# Altium footprint library texas.PCBLIB: 168 footprints (part 3 of 14)
Each footprint in its own frame and in the unit in brackets; x right, y up, seen from the top. Pads: shape width x height; smd on the part's side, far side on the other; paste and mask are expansions set on the pad; w line width, h text height; cw(c..) or ccw(c..) is an arc to the next point about the centre after c.
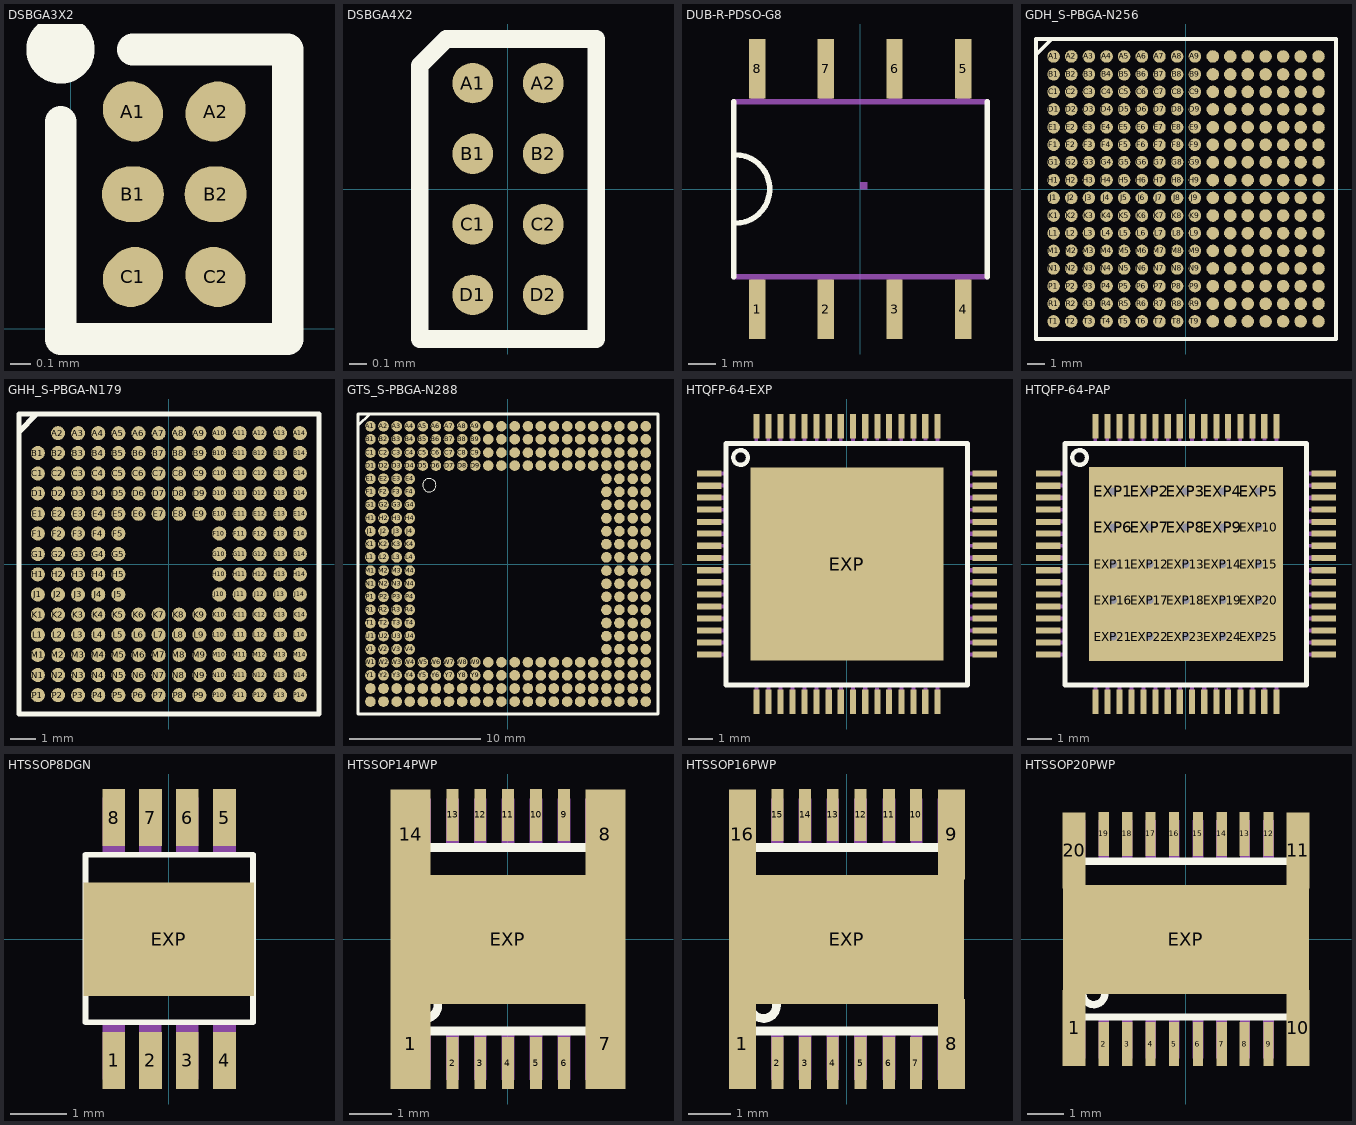
[diagram p2: the footprints below, top view; thin cyan lines are the x and y axes]

## DSBGA3X2 [mm]
height 0.65
pads (6):
  oval 0.3x0.27 smd rot 135 mask+0.05: A1(0.3,1.05) C2(0.7,0.25)
  oval 0.3x0.27 smd rot 45 mask+0.05: A2(0.7,1.05) C1(0.3,0.25)
  oval 0.3x0.27 smd mask+0.05: B1(0.3,0.65) B2(0.7,0.65)
Top Overlay:
  circle w0.229: c-0.05,1.35 r0.051
  lines w0.152: -0.05,1 -0.05,-0.05 1.05,-0.05 1.05,1.35 0.3,1.35

## DSBGA4X2 [mm]
height 0.65
pads (8):
  round 0.23 smd mask+0.05: A1(-0.2,0.6) A2(0.2,0.6) B1(-0.2,0.2) B2(0.2,0.2) C1(-0.2,-0.2) C2(0.2,-0.2) D1(-0.2,-0.6) D2(0.2,-0.6)
Top Overlay:
  lines w0.1: -0.5,-0.85 -0.5,0.7 -0.35,0.85 0.5,0.85 0.5,-0.85 -0.5,-0.85

## DUB-R-PDSO-G8 [mil]
pads (8):
  rect 24x87 smd: 1(-150,-175) 2(-50,-175) 3(50,-175) 4(150,-175) 5(150,175) 6(50,175) 7(-50,175) 8(-150,175)
Top Overlay:
  lines w8: -184.06,-127.95 -184.06,127 ; -181.89,-50 ccw(c-181.89,0) -181.89,50 ; 185,-127.95 185,127
Mechanical 4:
  rectangle: -159.65,125 -140.35,211
  rectangle: -59.65,125 -40.35,211
  rectangle: 41,125 60,211
  rectangle: 141,125 160,211
  rectangle: 141,-210.63 160,-125
  rectangle: 41,-210.63 60,-125
  rectangle: -59.65,-210.63 -40.35,-125
  rectangle: -159.65,-210.63 -140.35,-125
  region: 0,0 10,0 10,10 0,10
  region: 0,0 10,0 10,10 0,10
  region: 0,0 10,0 10,10 0,10
  region: 0,0 10,0 10,10 0,10
  region: 0,0 10,0 10,10 0,10
  region: 0,0 10,0 10,10 0,10
  region: 0,0 10,0 10,10 0,10
  region: 0,0 10,0 10,10 0,10
  region: 0,0 10,0 10,10 0,10
  region: 0,0 10,0 10,10 0,10
  region: 0,0 10,0 10,10 0,10
  region: 0,0 10,0 10,10 0,10
  lines w8: -184.06,-127.95 185,-127.95 ; -184.06,127 185,127

## GDH_S-PBGA-N256 [mil]
pads (256):
  rrect100% 28x28 smd: A1(-295.28,296) A2(-255.91,296) A3(-216.54,296) A4(-177.17,296) A5(-137.8,296) A6(-98.43,296) A7(-59.06,296) A8(-19.68,296) A9(20,296) A10(60,296) A11(99,296) A12(138,296) A13(178,296) A14(217,296) A15(256,296) A16(296,296) B1(-295.28,256) B2(-255.91,256) B3(-216.54,256) B4(-177.17,256) B5(-137.8,256) B6(-98.43,256) B7(-59.06,256) B8(-19.68,256) B9(20,256) B10(60,256) B11(99,256) B12(138,256) B13(178,256) B14(217,256) B15(256,256) B16(296,256) C1(-295.28,217) C2(-255.91,217) C3(-216.54,217) C4(-177.17,217) C5(-137.8,217) C6(-98.43,217) C7(-59.06,217) C8(-19.68,217) C9(20,217) C10(60,217) C11(99,217) C12(138,217) C13(178,217) C14(217,217) C15(256,217) C16(296,217) D1(-295.28,178) D2(-255.91,178) D3(-216.54,178) D4(-177.17,178) D5(-137.8,178) D6(-98.43,178) D7(-59.06,178) D8(-19.68,178) D9(20,178) D10(60,178) D11(99,178) D12(138,178) D13(178,178) D14(217,178) D15(256,178) D16(296,178) E1(-295.28,138) E2(-255.91,138) E3(-216.54,138) E4(-177.17,138) E5(-137.8,138) E6(-98.43,138) E7(-59.06,138) E8(-19.68,138) E9(20,138) E10(60,138) E11(99,138) E12(138,138) E13(178,138) E14(217,138) E15(256,138) E16(296,138) F1(-295.28,99) F2(-255.91,99) F3(-216.54,99) F4(-177.17,99) F5(-137.8,99) F6(-98.43,99) F7(-59.06,99) F8(-19.68,99) F9(20,99) F10(60,99) F11(99,99) F12(138,99) F13(178,99) F14(217,99) F15(256,99) F16(296,99) G1(-295.28,60) G2(-255.91,60) G3(-216.54,60) G4(-177.17,60) G5(-137.8,60) G6(-98.43,60) G7(-59.06,60) G8(-19.68,60) G9(20,60) G10(60,60) G11(99,60) G12(138,60) G13(178,60) G14(217,60) G15(256,60) G16(296,60) H1(-295.28,20) H2(-255.91,20) H3(-216.54,20) H4(-177.17,20) H5(-137.8,20) H6(-98.43,20) H7(-59.06,20) H8(-19.68,20) H9(20,20) H10(60,20) H11(99,20) H12(138,20) H13(178,20) H14(217,20) H15(256,20) H16(296,20) J1(-295.28,-19.68) J2(-255.91,-19.68) J3(-216.54,-19.68) J4(-177.17,-19.68) J5(-137.8,-19.68) J6(-98.43,-19.68) J7(-59.06,-19.68) J8(-19.68,-19.68) J9(20,-19.68) J10(60,-19.68) J11(99,-19.68) J12(138,-19.68) J13(178,-19.68) J14(217,-19.68) J15(256,-19.68) J16(296,-19.68) K1(-295.28,-59.06) K2(-255.91,-59.06) K3(-216.54,-59.06) K4(-177.17,-59.06) K5(-137.8,-59.06) K6(-98.43,-59.06) K7(-59.06,-59.06) K8(-19.68,-59.06) K9(20,-59.06) K10(60,-59.06) K11(99,-59.06) K12(138,-59.06) K13(178,-59.06) K14(217,-59.06) K15(256,-59.06) K16(296,-59.06) L1(-295.28,-98.43) L2(-255.91,-98.43) L3(-216.54,-98.43) L4(-177.17,-98.43) L5(-137.8,-98.43) L6(-98.43,-98.43) L7(-59.06,-98.43) L8(-19.68,-98.43) L9(20,-98.43) L10(60,-98.43) L11(99,-98.43) L12(138,-98.43) L13(178,-98.43) L14(217,-98.43) L15(256,-98.43) L16(296,-98.43) M1(-295.28,-137.8) M2(-255.91,-137.8) M3(-216.54,-137.8) M4(-177.17,-137.8) M5(-137.8,-137.8) M6(-98.43,-137.8) M7(-59.06,-137.8) M8(-19.68,-137.8) M9(20,-137.8) M10(60,-137.8) M11(99,-137.8) M12(138,-137.8) M13(178,-137.8) M14(217,-137.8) M15(256,-137.8) M16(296,-137.8) N1(-295.28,-177.17) N2(-255.91,-177.17) N3(-216.54,-177.17) N4(-177.17,-177.17) N5(-137.8,-177.17) N6(-98.43,-177.17) N7(-59.06,-177.17) N8(-19.68,-177.17) N9(20,-177.17) N10(60,-177.17) N11(99,-177.17) N12(138,-177.17) N13(178,-177.17) N14(217,-177.17) N15(256,-177.17) N16(296,-177.17) P1(-295.28,-216.54) P2(-255.91,-216.54) P3(-216.54,-216.54) P4(-177.17,-216.54) P5(-137.8,-216.54) P6(-98.43,-216.54) P7(-59.06,-216.54) P8(-19.68,-216.54) P9(20,-216.54) P10(60,-216.54) P11(99,-216.54) P12(138,-216.54) P13(178,-216.54) P14(217,-216.54) P15(256,-216.54) P16(296,-216.54) R1(-295.28,-255.91) R2(-255.91,-255.91) R3(-216.54,-255.91) R4(-177.17,-255.91) R5(-137.8,-255.91) R6(-98.43,-255.91) R7(-59.06,-255.91) R8(-19.68,-255.91) R9(20,-255.91) R10(60,-255.91) R11(99,-255.91) R12(138,-255.91) R13(178,-255.91) R14(217,-255.91) R15(256,-255.91) R16(296,-255.91) T1(-295.28,-295.28) T2(-255.91,-295.28) T3(-216.54,-295.28) T4(-177.17,-295.28) T5(-137.8,-295.28) T6(-98.43,-295.28) T7(-59.06,-295.28) T8(-19.68,-295.28) T9(20,-295.28) T10(60,-295.28) T11(99,-295.28) T12(138,-295.28) T13(178,-295.28) T14(217,-295.28) T15(256,-295.28) T16(296,-295.28)
Top Overlay:
  lines w8: -334.58,300 -299.21,335 ; -334.58,300 -334.58,-334.58 335,-334.58 335,335 -299.21,335 ; -334.58,300 -334.58,335 -299.21,335
Top Solder:
  drawing of 256 lines, arcs and shapes, not listed

## GHH_S-PBGA-N179 [mil]
pads (179):
  rrect100% 22x22 smd: A2(-173.23,205) A3(-141.73,205) A4(-110.24,205) A5(-78.74,205) A6(-47.24,205) A7(-15.75,205) A8(16,205) A9(48,205) A10(79,205) A11(111,205) A12(142,205) A13(174,205) A14(205,205) B1(-204.72,174) B2(-173.23,174) B3(-141.73,174) B4(-110.24,174) B5(-78.74,174) B6(-47.24,174) B7(-15.75,174) B8(16,174) B9(48,174) B10(79,174) B11(111,174) B12(142,174) B13(174,174) B14(205,174) C1(-204.72,142) C2(-173.23,142) C3(-141.73,142) C4(-110.24,142) C5(-78.74,142) C6(-47.24,142) C7(-15.75,142) C8(16,142) C9(48,142) C10(79,142) C11(111,142) C12(142,142) C13(174,142) C14(205,142) D1(-204.72,111) D2(-173.23,111) D3(-141.73,111) D4(-110.24,111) D5(-78.74,111) D6(-47.24,111) D7(-15.75,111) D8(16,111) D9(48,111) D10(79,111) D11(111,111) D12(142,111) D13(174,111) D14(205,111) E1(-204.72,79) E2(-173.23,79) E3(-141.73,79) E4(-110.24,79) E5(-78.74,79) E6(-47.24,79) E7(-15.75,79) E8(16,79) E9(48,79) E10(79,79) E11(111,79) E12(142,79) E13(174,79) E14(205,79) F1(-204.72,48) F2(-173.23,48) F3(-141.73,48) F4(-110.24,48) F5(-78.74,48) F10(79,48) F11(111,48) F12(142,48) F13(174,48) F14(205,48) G1(-204.72,16) G2(-173.23,16) G3(-141.73,16) G4(-110.24,16) G5(-78.74,16) G10(79,16) G11(111,16) G12(142,16) G13(174,16) G14(205,16) H1(-204.72,-15.75) H2(-173.23,-15.75) H3(-141.73,-15.75) H4(-110.24,-15.75) H5(-78.74,-15.75) H10(79,-15.75) H11(111,-15.75) H12(142,-15.75) H13(174,-15.75) H14(205,-15.75) J1(-204.72,-47.24) J2(-173.23,-47.24) J3(-141.73,-47.24) J4(-110.24,-47.24) J5(-78.74,-47.24) J10(79,-47.24) J11(111,-47.24) J12(142,-47.24) J13(174,-47.24) J14(205,-47.24) K1(-204.72,-78.74) K2(-173.23,-78.74) K3(-141.73,-78.74) K4(-110.24,-78.74) K5(-78.74,-78.74) K6(-47.24,-78.74) K7(-15.75,-78.74) K8(16,-78.74) K9(48,-78.74) K10(79,-78.74) K11(111,-78.74) K12(142,-78.74) K13(174,-78.74) K14(205,-78.74) L1(-204.72,-110.24) L2(-173.23,-110.24) L3(-141.73,-110.24) L4(-110.24,-110.24) L5(-78.74,-110.24) L6(-47.24,-110.24) L7(-15.75,-110.24) L8(16,-110.24) L9(48,-110.24) L10(79,-110.24) L11(111,-110.24) L12(142,-110.24) L13(174,-110.24) L14(205,-110.24) M1(-204.72,-141.73) M2(-173.23,-141.73) M3(-141.73,-141.73) M4(-110.24,-141.73) M5(-78.74,-141.73) M6(-47.24,-141.73) M7(-15.75,-141.73) M8(16,-141.73) M9(48,-141.73) M10(79,-141.73) M11(111,-141.73) M12(142,-141.73) M13(174,-141.73) M14(205,-141.73) N1(-204.72,-173.23) N2(-173.23,-173.23) N3(-141.73,-173.23) N4(-110.24,-173.23) N5(-78.74,-173.23) N6(-47.24,-173.23) N7(-15.75,-173.23) N8(16,-173.23) N9(48,-173.23) N10(79,-173.23) N11(111,-173.23) N12(142,-173.23) N13(174,-173.23) N14(205,-173.23) P1(-204.72,-204.72) P2(-173.23,-204.72) P3(-141.73,-204.72) P4(-110.24,-204.72) P5(-78.74,-204.72) P6(-47.24,-204.72) P7(-15.75,-204.72) P8(16,-204.72) P9(48,-204.72) P10(79,-204.72) P11(111,-204.72) P12(142,-204.72) P13(174,-204.72) P14(205,-204.72)
Top Overlay:
  lines w8: -234.19,207 -234.19,235 -206.69,235 ; -234.19,207 -234.19,-234.19 235,-234.19 235,235 -206.69,235 ; -234.19,207 -206.69,235
Top Solder:
  drawing of 179 lines, arcs and shapes, not listed

## GTS_S-PBGA-N288 [mil]
pads (288):
  rrect100% 32x32 smd: A1(-413.39,414) A2(-374.02,414) A3(-334.65,414) A4(-295.28,414) A5(-255.91,414) A6(-216.54,414) A7(-177.17,414) A8(-137.8,414) A9(-98.43,414) A10(-59.06,414) A11(-19.68,414) A12(20,414) A13(60,414) A14(99,414) A15(138,414) A16(178,414) A17(217,414) A18(256,414) A19(296,414) A20(335,414) A21(375,414) A22(414,414) AA1(-413.39,-374.02) AA2(-374.02,-374.02) AA3(-334.65,-374.02) AA4(-295.28,-374.02) AA5(-255.91,-374.02) AA6(-216.54,-374.02) AA7(-177.17,-374.02) AA8(-137.8,-374.02) AA9(-98.43,-374.02) AA10(-59.06,-374.02) AA11(-19.68,-374.02) AA12(20,-374.02) AA13(60,-374.02) AA14(99,-374.02) AA15(138,-374.02) AA16(178,-374.02) AA17(217,-374.02) AA18(256,-374.02) AA19(296,-374.02) AA20(335,-374.02) AA21(375,-374.02) AA22(414,-374.02) AB1(-413.39,-413.39) AB2(-374.02,-413.39) AB3(-334.65,-413.39) AB4(-295.28,-413.39) AB5(-255.91,-413.39) AB6(-216.54,-413.39) AB7(-177.17,-413.39) AB8(-137.8,-413.39) AB9(-98.43,-413.39) AB10(-59.06,-413.39) AB11(-19.68,-413.39) AB12(20,-413.39) AB13(60,-413.39) AB14(99,-413.39) AB15(138,-413.39) AB16(178,-413.39) AB17(217,-413.39) AB18(256,-413.39) AB19(296,-413.39) AB20(335,-413.39) AB21(375,-413.39) AB22(414,-413.39) B1(-413.39,375) B2(-374.02,375) B3(-334.65,375) B4(-295.28,375) B5(-255.91,375) B6(-216.54,375) B7(-177.17,375) B8(-137.8,375) B9(-98.43,375) B10(-59.06,375) B11(-19.68,375) B12(20,375) B13(60,375) B14(99,375) B15(138,375) B16(178,375) B17(217,375) B18(256,375) B19(296,375) B20(335,375) B21(375,375) B22(414,375) C1(-413.39,335) C2(-374.02,335) C3(-334.65,335) C4(-295.28,335) C5(-255.91,335) C6(-216.54,335) C7(-177.17,335) C8(-137.8,335) C9(-98.43,335) C10(-59.06,335) C11(-19.68,335) C12(20,335) C13(60,335) C14(99,335) C15(138,335) C16(178,335) C17(217,335) C18(256,335) C19(296,335) C20(335,335) C21(375,335) C22(414,335) D1(-413.39,296) D2(-374.02,296) D3(-334.65,296) D4(-295.28,296) D5(-255.91,296) D6(-216.54,296) D7(-177.17,296) D8(-137.8,296) D9(-98.43,296) D10(-59.06,296) D11(-19.68,296) D12(20,296) D13(60,296) D14(99,296) D15(138,296) D16(178,296) D17(217,296) D18(256,296) D19(296,296) D20(335,296) D21(375,296) D22(414,296) E1(-413.39,256) E2(-374.02,256) E3(-334.65,256) E4(-295.28,256) E19(296,256) E20(335,256) E21(375,256) E22(414,256) F1(-413.39,217) F2(-374.02,217) F3(-334.65,217) F4(-295.28,217) F19(296,217) F20(335,217) F21(375,217) F22(414,217) G1(-413.39,178) G2(-374.02,178) G3(-334.65,178) G4(-295.28,178) G19(296,178) G20(335,178) G21(375,178) G22(414,178) H1(-413.39,138) H2(-374.02,138) H3(-334.65,138) H4(-295.28,138) H19(296,138) H20(335,138) H21(375,138) H22(414,138) J1(-413.39,99) J2(-374.02,99) J3(-334.65,99) J4(-295.28,99) J19(296,99) J20(335,99) J21(375,99) J22(414,99) K1(-413.39,60) K2(-374.02,60) K3(-334.65,60) K4(-295.28,60) K19(296,60) K20(335,60) K21(375,60) K22(414,60) L1(-413.39,20) L2(-374.02,20) L3(-334.65,20) L4(-295.28,20) L19(296,20) L20(335,20) L21(375,20) L22(414,20) M1(-413.39,-19.68) M2(-374.02,-19.68) M3(-334.65,-19.68) M4(-295.28,-19.68) M19(296,-19.68) M20(335,-19.68) M21(375,-19.68) M22(414,-19.68) N1(-413.39,-59.06) N2(-374.02,-59.06) N3(-334.65,-59.06) N4(-295.28,-59.06) N19(296,-59.06) N20(335,-59.06) N21(375,-59.06) N22(414,-59.06) P1(-413.39,-98.43) P2(-374.02,-98.43) P3(-334.65,-98.43) P4(-295.28,-98.43) P19(296,-98.43) P20(335,-98.43) P21(375,-98.43) P22(414,-98.43) R1(-413.39,-137.8) R2(-374.02,-137.8) R3(-334.65,-137.8) R4(-295.28,-137.8) R19(296,-137.8) R20(335,-137.8) R21(375,-137.8) R22(414,-137.8) T1(-413.39,-177.17) T2(-374.02,-177.17) T3(-334.65,-177.17) T4(-295.28,-177.17) T19(296,-177.17) T20(335,-177.17) T21(375,-177.17) T22(414,-177.17) U1(-413.39,-216.54) U2(-374.02,-216.54) U3(-334.65,-216.54) U4(-295.28,-216.54) U19(296,-216.54) U20(335,-216.54) U21(375,-216.54) U22(414,-216.54) V1(-413.39,-255.91) V2(-374.02,-255.91) V3(-334.65,-255.91) V4(-295.28,-255.91) V19(296,-255.91) V20(335,-255.91) V21(375,-255.91) V22(414,-255.91) W1(-413.39,-295.28) W2(-374.02,-295.28) W3(-334.65,-295.28) W4(-295.28,-295.28) W5(-255.91,-295.28) W6(-216.54,-295.28) W7(-177.17,-295.28) W8(-137.8,-295.28) W9(-98.43,-295.28) W10(-59.06,-295.28) W11(-19.68,-295.28) W12(20,-295.28) W13(60,-295.28) W14(99,-295.28) W15(138,-295.28) W16(178,-295.28) W17(217,-295.28) W18(256,-295.28) W19(296,-295.28) W20(335,-295.28) W21(375,-295.28) W22(414,-295.28) Y1(-413.39,-334.65) Y2(-374.02,-334.65) Y3(-334.65,-334.65) Y4(-295.28,-334.65) Y5(-255.91,-334.65) Y6(-216.54,-334.65) Y7(-177.17,-334.65) Y8(-137.8,-334.65) Y9(-98.43,-334.65) Y10(-59.06,-334.65) Y11(-19.68,-334.65) Y12(20,-334.65) Y13(60,-334.65) Y14(99,-334.65) Y15(138,-334.65) Y16(178,-334.65) Y17(217,-334.65) Y18(256,-334.65) Y19(296,-334.65) Y20(335,-334.65) Y21(375,-334.65) Y22(414,-334.65)
Top Overlay:
  circle w0: c-236.22,237 r20
  lines w8: -450.72,416 -450.72,451 -415.35,451 ; -450.72,416 -450.72,-450.72 451,-450.72 451,451 -415.35,451 ; -450.72,416 -415.35,451
Top Solder:
  drawing of 288 lines, arcs and shapes, not listed

## HTQFP-64-EXP [mil]
pads (65):
  rect 40x10 smd: 1(-224.41,148) 2(-224.41,128) 3(-224.41,109) 4(-224.41,89) 5(-224.41,69) 6(-224.41,50) 7(-224.41,30) 8(-224.41,10) 9(-224.41,-9.84) 10(-224.41,-29.53) 11(-224.41,-49.21) 12(-224.41,-68.9) 13(-224.41,-88.58) 14(-224.41,-108.27) 15(-224.41,-127.95) 16(-224.41,-147.64) 33(225,-147.64) 34(225,-127.95) 35(225,-108.27) 36(225,-88.58) 37(225,-68.9) 38(225,-49.21) 39(225,-29.53) 40(225,-9.84) 41(225,10) 42(225,30) 43(225,50) 44(225,69) 45(225,89) 46(225,109) 47(225,128) 48(225,148)
  rect 10x40 smd: 17(-147.64,-224.41) 18(-127.95,-224.41) 19(-108.27,-224.41) 20(-88.58,-224.41) 21(-68.9,-224.41) 22(-49.21,-224.41) 23(-29.53,-224.41) 24(-9.84,-224.41) 25(10,-224.41) 26(30,-224.41) 27(50,-224.41) 28(69,-224.41) 29(89,-224.41) 30(109,-224.41) 31(128,-224.41) 32(148,-224.41) 49(148,225) 50(128,225) 51(109,225) 52(89,225) 53(69,225) 54(50,225) 55(30,225) 56(10,225) 57(-9.84,225) 58(-29.53,225) 59(-49.21,225) 60(-68.9,225) 61(-88.58,225) 62(-108.27,225) 63(-127.95,225) 64(-147.64,225)
  rect 315x315 smd: EXP(0,0)
Top Overlay:
  circle w7: c-173.23,174 r12
  lines w8: -196.85,-196.85 -196.85,197 197,197 197,-196.85 -196.85,-196.85
Top Paste:
  region: -152.64,244.69 -152.64,205.31 -142.64,205.31 -142.64,244.69
  region: -132.95,244.69 -132.95,205.31 -122.95,205.31 -122.95,244.69
  region: -113.27,244.69 -113.27,205.31 -103.27,205.31 -103.27,244.69
  region: -93.58,244.69 -93.58,205.31 -83.58,205.31 -83.58,244.69
  region: -73.9,244.69 -73.9,205.31 -63.9,205.31 -63.9,244.69
  region: -54.21,244.69 -54.21,205.31 -44.21,205.31 -44.21,244.69
  region: -34.53,244.69 -34.53,205.31 -24.53,205.31 -24.53,244.69
  region: -14.76,244.76 -14.76,205.24 -4.76,205.24 -4.76,244.76
  region: 5.08,244.92 5.08,205.08 15.08,205.08 15.08,244.92
  region: 25,245 25,205 35,205 35,245
  region: 44.5,244.5 44.5,205.5 54.5,205.5 54.5,244.5
  region: 64.5,244.5 64.5,205.5 74.5,205.5 74.5,244.5
  region: 84,245 84,205 94,205 94,245
  region: 103.5,244.5 103.5,205.5 113.5,205.5 113.5,244.5
  region: 123.5,244.5 123.5,205.5 133.5,205.5 133.5,244.5
  region: 143,245 143,205 153,205 153,245
  region: 245,153 205,153 205,143 245,143
  region: 245,133 205,133 205,124 245,124
  region: 245,114 205,114 205,104 245,104
  region: 245,94 205,94 205,84 245,84
  region: 245,74 205,74 205,64 245,64
  region: 245,55 205,55 205,45 245,45
  region: 245,35 205,35 205,25 245,25
  region: 245,15 205,15 205,5 245,5
  region: 245,-4.92 205,-4.92 205,-14.76 245,-14.76
  region: 245,-24.61 205,-24.61 205,-34.45 245,-34.45
  region: 245,-44.29 205,-44.29 205,-54.13 245,-54.13
  region: 245,-63.98 205,-63.98 205,-73.82 245,-73.82
  region: 245,-83.66 205,-83.66 205,-93.5 245,-93.5
  region: 245,-103.35 205,-103.35 205,-113.19 245,-113.19
  region: 245,-123.03 205,-123.03 205,-132.87 245,-132.87
  region: 245,-142.72 205,-142.72 205,-152.56 245,-152.56
  region: 152.92,-244.41 152.92,-204.41 143.08,-204.41 143.08,-244.41
  region: 133.42,-243.91 133.42,-204.91 123.58,-204.91 123.58,-243.91
  region: 113.42,-243.91 113.42,-204.91 103.58,-204.91 103.58,-243.91
  region: 93.92,-244.41 93.92,-204.41 84.08,-204.41 84.08,-244.41
  region: 74.42,-243.91 74.42,-204.91 64.58,-204.91 64.58,-243.91
  region: 54.42,-243.91 54.42,-204.91 44.58,-204.91 44.58,-243.91
  region: 34.92,-244.41 34.92,-204.41 25.08,-204.41 25.08,-244.41
  region: 15,-244.33 15,-204.49 5.16,-204.49 5.16,-244.33
  region: -4.84,-244.17 -4.84,-204.65 -14.69,-204.65 -14.69,-244.17
  region: -24.61,-244.09 -24.61,-204.72 -34.45,-204.72 -34.45,-244.09
  region: -44.29,-244.09 -44.29,-204.72 -54.13,-204.72 -54.13,-244.09
  region: -63.98,-244.09 -63.98,-204.72 -73.82,-204.72 -73.82,-244.09
  region: -83.66,-244.09 -83.66,-204.72 -93.5,-204.72 -93.5,-244.09
  region: -103.35,-244.09 -103.35,-204.72 -113.19,-204.72 -113.19,-244.09
  region: -123.03,-244.09 -123.03,-204.72 -132.87,-204.72 -132.87,-244.09
  region: -142.72,-244.09 -142.72,-204.72 -152.56,-204.72 -152.56,-244.09
  rectangle: -244.09,-152.56 -204.72,-142.72
  rectangle: -244.09,-132.87 -204.72,-123.03
  rectangle: -244.09,-113.19 -204.72,-103.35
  rectangle: -244.09,-93.5 -204.72,-83.66
  rectangle: -244.09,-73.82 -204.72,-63.98
  rectangle: -244.09,-54.13 -204.72,-44.29
  rectangle: -244.09,-34.45 -204.72,-24.61
  rectangle: -244.09,-14.76 -204.72,-4.92
  rectangle: -244.09,5 -204.72,15
  rectangle: -244.09,25 -204.72,35
  rectangle: -244.09,45 -204.72,55
  rectangle: -244.09,64 -204.72,74
  rectangle: -244.09,84 -204.72,94
  rectangle: -244.09,104 -204.72,114
  rectangle: -244.09,124 -204.72,133
  rectangle: -244.09,143 -204.72,153
Top Solder:
  rectangle: -157.48,-157.48 158,158
  region: -152.64,244.69 -152.64,205.31 -142.64,205.31 -142.64,244.69
  region: -132.95,244.69 -132.95,205.31 -122.95,205.31 -122.95,244.69
  region: -113.27,244.69 -113.27,205.31 -103.27,205.31 -103.27,244.69
  region: -93.58,244.69 -93.58,205.31 -83.58,205.31 -83.58,244.69
  region: -73.9,244.69 -73.9,205.31 -63.9,205.31 -63.9,244.69
  region: -54.21,244.69 -54.21,205.31 -44.21,205.31 -44.21,244.69
  region: -34.53,244.69 -34.53,205.31 -24.53,205.31 -24.53,244.69
  region: -14.76,244.76 -14.76,205.24 -4.76,205.24 -4.76,244.76
  region: 5.08,244.92 5.08,205.08 15.08,205.08 15.08,244.92
  region: 25,245 25,205 35,205 35,245
  region: 44.5,244.5 44.5,205.5 54.5,205.5 54.5,244.5
  region: 64.5,244.5 64.5,205.5 74.5,205.5 74.5,244.5
  region: 84,245 84,205 94,205 94,245
  region: 103.5,244.5 103.5,205.5 113.5,205.5 113.5,244.5
  region: 123.5,244.5 123.5,205.5 133.5,205.5 133.5,244.5
  region: 143,245 143,205 153,205 153,245
  region: 245,153 205,153 205,143 245,143
  region: 245,133 205,133 205,124 245,124
  region: 245,114 205,114 205,104 245,104
  region: 245,94 205,94 205,84 245,84
  region: 245,74 205,74 205,64 245,64
  region: 245,55 205,55 205,45 245,45
  region: 245,35 205,35 205,25 245,25
  region: 245,15 205,15 205,5 245,5
  region: 245,-4.92 205,-4.92 205,-14.76 245,-14.76
  region: 245,-24.61 205,-24.61 205,-34.45 245,-34.45
  region: 245,-44.29 205,-44.29 205,-54.13 245,-54.13
  region: 245,-63.98 205,-63.98 205,-73.82 245,-73.82
  region: 245,-83.66 205,-83.66 205,-93.5 245,-93.5
  region: 245,-103.35 205,-103.35 205,-113.19 245,-113.19
  region: 245,-123.03 205,-123.03 205,-132.87 245,-132.87
  region: 245,-142.72 205,-142.72 205,-152.56 245,-152.56
  region: 152.92,-244.41 152.92,-204.41 143.08,-204.41 143.08,-244.41
  region: 133.42,-243.91 133.42,-204.91 123.58,-204.91 123.58,-243.91
  region: 113.42,-243.91 113.42,-204.91 103.58,-204.91 103.58,-243.91
  region: 93.92,-244.41 93.92,-204.41 84.08,-204.41 84.08,-244.41
  region: 74.42,-243.91 74.42,-204.91 64.58,-204.91 64.58,-243.91
  region: 54.42,-243.91 54.42,-204.91 44.58,-204.91 44.58,-243.91
  region: 34.92,-244.41 34.92,-204.41 25.08,-204.41 25.08,-244.41
  region: 15,-244.33 15,-204.49 5.16,-204.49 5.16,-244.33
  region: -4.84,-244.17 -4.84,-204.65 -14.69,-204.65 -14.69,-244.17
  region: -24.61,-244.09 -24.61,-204.72 -34.45,-204.72 -34.45,-244.09
  region: -44.29,-244.09 -44.29,-204.72 -54.13,-204.72 -54.13,-244.09
  region: -63.98,-244.09 -63.98,-204.72 -73.82,-204.72 -73.82,-244.09
  region: -83.66,-244.09 -83.66,-204.72 -93.5,-204.72 -93.5,-244.09
  region: -103.35,-244.09 -103.35,-204.72 -113.19,-204.72 -113.19,-244.09
  region: -123.03,-244.09 -123.03,-204.72 -132.87,-204.72 -132.87,-244.09
  region: -142.72,-244.09 -142.72,-204.72 -152.56,-204.72 -152.56,-244.09
  rectangle: -244.09,-152.56 -204.72,-142.72
  rectangle: -244.09,-132.87 -204.72,-123.03
  rectangle: -244.09,-113.19 -204.72,-103.35
  rectangle: -244.09,-93.5 -204.72,-83.66
  rectangle: -244.09,-73.82 -204.72,-63.98
  rectangle: -244.09,-54.13 -204.72,-44.29
  rectangle: -244.09,-34.45 -204.72,-24.61
  rectangle: -244.09,-14.76 -204.72,-4.92
  rectangle: -244.09,5 -204.72,15
  rectangle: -244.09,25 -204.72,35
  rectangle: -244.09,45 -204.72,55
  rectangle: -244.09,64 -204.72,74
  rectangle: -244.09,84 -204.72,94
  rectangle: -244.09,104 -204.72,114
  rectangle: -244.09,124 -204.72,133
  rectangle: -244.09,143 -204.72,153
Mechanical 4:
  region: -150.64,240.78 -150.64,201.22 -144.64,201.22 -144.64,240.78
  region: -130.95,240.78 -130.95,201.22 -124.95,201.22 -124.95,240.78
  region: -111.27,240.78 -111.27,201.22 -105.27,201.22 -105.27,240.78
  region: -91.58,240.78 -91.58,201.22 -85.58,201.22 -85.58,240.78
  region: -71.9,240.78 -71.9,201.22 -65.9,201.22 -65.9,240.78
  region: -52.21,240.78 -52.21,201.22 -46.21,201.22 -46.21,240.78
  region: -32.53,240.78 -32.53,201.22 -26.53,201.22 -26.53,240.78
  region: -12.81,240.81 -12.81,201.19 -6.81,201.19 -6.81,240.81
  region: 7.03,240.97 7.03,201.03 13.03,201.03 13.03,240.97
  region: 27,241 27,201 33,201 33,241
  region: 46.5,240.5 46.5,201.5 52.5,201.5 52.5,240.5
  region: 66.5,240.5 66.5,201.5 72.5,201.5 72.5,240.5
  region: 86,241 86,201 92,201 92,241
  region: 106,241 106,201 112,201 112,241
  region: 125.5,240.5 125.5,201.5 131.5,201.5 131.5,240.5
  region: 145,241 145,201 151,201 151,241
  region: 241,151 201,151 201,145 241,145
  region: 241,132 201,132 201,125 241,125
  region: 241,112 201,112 201,105 241,105
  region: 241,92 201,92 201,86 241,86
  region: 241,73 201,73 201,66 241,66
  region: 241,53 201,53 201,46 241,46
  region: 241,33 201,33 201,27 241,27
  region: 241,14 201,14 201,7 241,7
  region: 241,-6.5 201,-6.5 201,-13.19 241,-13.19
  region: 241,-26.18 201,-26.18 201,-32.87 241,-32.87
  region: 241,-45.87 201,-45.87 201,-52.56 241,-52.56
  region: 241,-65.55 201,-65.55 201,-72.24 241,-72.24
  region: 241,-85.24 201,-85.24 201,-91.93 241,-91.93
  region: 241,-104.92 201,-104.92 201,-111.61 241,-111.61
  region: 241,-124.61 201,-124.61 201,-131.3 241,-131.3
  region: 241,-144.29 201,-144.29 201,-150.98 241,-150.98
  region: 151.35,-240.37 151.35,-200.37 144.65,-200.37 144.65,-240.37
  region: 131.85,-239.87 131.85,-200.87 125.15,-200.87 125.15,-239.87
  region: 112.35,-240.37 112.35,-200.37 105.65,-200.37 105.65,-240.37
  region: 92.35,-240.37 92.35,-200.37 85.65,-200.37 85.65,-240.37
  region: 72.85,-239.87 72.85,-200.87 66.15,-200.87 66.15,-239.87
  region: 52.85,-239.87 52.85,-200.87 46.15,-200.87 46.15,-239.87
  region: 33.35,-240.37 33.35,-200.37 26.65,-200.37 26.65,-240.37
  region: 13.38,-240.34 13.38,-200.4 6.68,-200.4 6.68,-240.34
  region: -6.47,-240.19 -6.47,-200.56 -13.16,-200.56 -13.16,-240.19
  region: -26.18,-240.16 -26.18,-200.59 -32.87,-200.59 -32.87,-240.16
  region: -45.87,-240.16 -45.87,-200.59 -52.56,-200.59 -52.56,-240.16
  region: -65.55,-240.16 -65.55,-200.59 -72.24,-200.59 -72.24,-240.16
  region: -85.24,-240.16 -85.24,-200.59 -91.93,-200.59 -91.93,-240.16
  region: -104.92,-240.16 -104.92,-200.59 -111.61,-200.59 -111.61,-240.16
  region: -124.61,-240.16 -124.61,-200.59 -131.3,-200.59 -131.3,-240.16
  region: -144.29,-240.16 -144.29,-200.59 -150.98,-200.59 -150.98,-240.16
  rectangle: -240.16,-150.98 -200.59,-144.29
  rectangle: -240.16,-131.3 -200.59,-124.61
  rectangle: -240.16,-111.61 -200.59,-104.92
  rectangle: -240.16,-91.93 -200.59,-85.24
  rectangle: -240.16,-72.24 -200.59,-65.55
  rectangle: -240.16,-52.56 -200.59,-45.87
  rectangle: -240.16,-32.87 -200.59,-26.18
  rectangle: -240.16,-13.19 -200.59,-6.5
  rectangle: -240.16,7 -200.59,14
  rectangle: -240.16,27 -200.59,33
  rectangle: -240.16,46 -200.59,53
  rectangle: -240.16,66 -200.59,73
  rectangle: -240.16,86 -200.59,92
  rectangle: -240.16,105 -200.59,112
  rectangle: -240.16,125 -200.59,132
  rectangle: -240.16,145 -200.59,151

## HTQFP-64-PAP [mil]
pads (89):
  rect 40x10 smd: 1(-224.41,148) 2(-224.41,128) 3(-224.41,109) 4(-224.41,89) 5(-224.41,69) 6(-224.41,50) 7(-224.41,30) 8(-224.41,10) 9(-224.41,-9.84) 10(-224.41,-29.53) 11(-224.41,-49.21) 12(-224.41,-68.9) 13(-224.41,-88.58) 14(-224.41,-108.27) 15(-224.41,-127.95) 16(-224.41,-147.64) 33(225,-147.64) 34(225,-127.95) 35(225,-108.27) 36(225,-88.58) 37(225,-68.9) 38(225,-49.21) 39(225,-29.53) 40(225,-9.84) 41(225,10) 42(225,30) 43(225,50) 44(225,69) 45(225,89) 46(225,109) 47(225,128) 48(225,148)
  rect 10x40 smd: 17(-147.64,-224.41) 18(-127.95,-224.41) 19(-108.27,-224.41) 20(-88.58,-224.41) 21(-68.9,-224.41) 22(-49.21,-224.41) 23(-29.53,-224.41) 24(-9.84,-224.41) 25(10,-224.41) 26(30,-224.41) 27(50,-224.41) 28(69,-224.41) 29(89,-224.41) 30(109,-224.41) 31(128,-224.41) 32(148,-224.41) 49(148,225) 50(128,225) 51(109,225) 52(89,225) 53(69,225) 54(50,225) 55(30,225) 56(10,225) 57(-9.84,225) 58(-29.53,225) 59(-49.21,225) 60(-68.9,225) 61(-88.58,225) 62(-108.27,225) 63(-127.95,225) 64(-147.64,225)
  rect 79x79 hole 12: EXP1(-118.11,119) EXP2(-59.06,119) EXP3(0,119) EXP4(60,119) EXP5(119,119) EXP6(-118.11,60) EXP7(-59.06,60) EXP8(0,60) EXP9(60,60) EXP10(119,60) EXP11(-118.11,0) EXP12(-59.06,0) EXP13(0,0) EXP14(60,0) EXP15(119,0) EXP16(-118.11,-59.06) EXP17(-59.06,-59.06) EXP18(0,-59.06) EXP19(60,-59.06) EXP20(119,-59.06) EXP21(-118.11,-118.11) EXP22(-59.06,-118.11) EXP23(0,-118.11) EXP24(60,-118.11) EXP25(119,-118.11)
Top Overlay:
  circle w7: c-173.23,174 r12
  lines w8: -196.85,-196.85 197,-196.85 197,197 -196.85,197 -196.85,-196.85
Top Paste:
  rectangle: -244.09,143 -204.72,153
  rectangle: -244.09,124 -204.72,133
  rectangle: -244.09,104 -204.72,114
  rectangle: -244.09,84 -204.72,94
  rectangle: -244.09,64 -204.72,74
  rectangle: -244.09,45 -204.72,55
  rectangle: -244.09,25 -204.72,35
  rectangle: -244.09,5 -204.72,15
  rectangle: -244.09,-14.76 -204.72,-4.92
  rectangle: -244.09,-34.45 -204.72,-24.61
  rectangle: -244.09,-54.13 -204.72,-44.29
  rectangle: -244.09,-73.82 -204.72,-63.98
  rectangle: -244.09,-93.5 -204.72,-83.66
  rectangle: -244.09,-113.19 -204.72,-103.35
  rectangle: -244.09,-132.87 -204.72,-123.03
  rectangle: -244.09,-152.56 -204.72,-142.72
  region: -142.72,-244.09 -142.72,-204.72 -152.56,-204.72 -152.56,-244.09
  region: -123.03,-244.09 -123.03,-204.72 -132.87,-204.72 -132.87,-244.09
  region: -103.35,-244.09 -103.35,-204.72 -113.19,-204.72 -113.19,-244.09
  region: -83.66,-244.09 -83.66,-204.72 -93.5,-204.72 -93.5,-244.09
  region: -63.98,-244.09 -63.98,-204.72 -73.82,-204.72 -73.82,-244.09
  region: -44.29,-244.09 -44.29,-204.72 -54.13,-204.72 -54.13,-244.09
  region: -24.61,-244.09 -24.61,-204.72 -34.45,-204.72 -34.45,-244.09
  region: -4.84,-244.17 -4.84,-204.65 -14.69,-204.65 -14.69,-244.17
  region: 15,-244.33 15,-204.49 5.16,-204.49 5.16,-244.33
  region: 34.92,-244.41 34.92,-204.41 25.08,-204.41 25.08,-244.41
  region: 54.42,-243.91 54.42,-204.91 44.58,-204.91 44.58,-243.91
  region: 74.42,-243.91 74.42,-204.91 64.58,-204.91 64.58,-243.91
  region: 93.92,-244.41 93.92,-204.41 84.08,-204.41 84.08,-244.41
  region: 113.42,-243.91 113.42,-204.91 103.58,-204.91 103.58,-243.91
  region: 133.42,-243.91 133.42,-204.91 123.58,-204.91 123.58,-243.91
  region: 152.92,-244.41 152.92,-204.41 143.08,-204.41 143.08,-244.41
  region: 245,-142.72 205,-142.72 205,-152.56 245,-152.56
  region: 245,-123.03 205,-123.03 205,-132.87 245,-132.87
  region: 245,-103.35 205,-103.35 205,-113.19 245,-113.19
  region: 245,-83.66 205,-83.66 205,-93.5 245,-93.5
  region: 245,-63.98 205,-63.98 205,-73.82 245,-73.82
  region: 245,-44.29 205,-44.29 205,-54.13 245,-54.13
  region: 245,-24.61 205,-24.61 205,-34.45 245,-34.45
  region: 245,-4.92 205,-4.92 205,-14.76 245,-14.76
  region: 245,15 205,15 205,5 245,5
  region: 245,35 205,35 205,25 245,25
  region: 245,55 205,55 205,45 245,45
  region: 245,74 205,74 205,64 245,64
  region: 245,94 205,94 205,84 245,84
  region: 245,114 205,114 205,104 245,104
  region: 245,133 205,133 205,124 245,124
  region: 245,153 205,153 205,143 245,143
  region: 143,245 143,205 153,205 153,245
  region: 123.5,244.5 123.5,205.5 133.5,205.5 133.5,244.5
  region: 103.5,244.5 103.5,205.5 113.5,205.5 113.5,244.5
  region: 84,245 84,205 94,205 94,245
  region: 64.5,244.5 64.5,205.5 74.5,205.5 74.5,244.5
  region: 44.5,244.5 44.5,205.5 54.5,205.5 54.5,244.5
  region: 25,245 25,205 35,205 35,245
  region: 5.08,244.92 5.08,205.08 15.08,205.08 15.08,244.92
  region: -14.76,244.76 -14.76,205.24 -4.76,205.24 -4.76,244.76
  region: -34.53,244.69 -34.53,205.31 -24.53,205.31 -24.53,244.69
  region: -54.21,244.69 -54.21,205.31 -44.21,205.31 -44.21,244.69
  region: -73.9,244.69 -73.9,205.31 -63.9,205.31 -63.9,244.69
  region: -93.58,244.69 -93.58,205.31 -83.58,205.31 -83.58,244.69
  region: -113.27,244.69 -113.27,205.31 -103.27,205.31 -103.27,244.69
  region: -132.95,244.69 -132.95,205.31 -122.95,205.31 -122.95,244.69
  region: -152.64,244.69 -152.64,205.31 -142.64,205.31 -142.64,244.69
Top Solder:
  rectangle: -244.09,143 -204.72,153
  rectangle: -244.09,124 -204.72,133
  rectangle: -244.09,104 -204.72,114
  rectangle: -244.09,84 -204.72,94
  rectangle: -244.09,64 -204.72,74
  rectangle: -244.09,45 -204.72,55
  rectangle: -244.09,25 -204.72,35
  rectangle: -244.09,5 -204.72,15
  rectangle: -244.09,-14.76 -204.72,-4.92
  rectangle: -244.09,-34.45 -204.72,-24.61
  rectangle: -244.09,-54.13 -204.72,-44.29
  rectangle: -244.09,-73.82 -204.72,-63.98
  rectangle: -244.09,-93.5 -204.72,-83.66
  rectangle: -244.09,-113.19 -204.72,-103.35
  rectangle: -244.09,-132.87 -204.72,-123.03
  rectangle: -244.09,-152.56 -204.72,-142.72
  region: -142.72,-244.09 -142.72,-204.72 -152.56,-204.72 -152.56,-244.09
  region: -123.03,-244.09 -123.03,-204.72 -132.87,-204.72 -132.87,-244.09
  region: -103.35,-244.09 -103.35,-204.72 -113.19,-204.72 -113.19,-244.09
  region: -83.66,-244.09 -83.66,-204.72 -93.5,-204.72 -93.5,-244.09
  region: -63.98,-244.09 -63.98,-204.72 -73.82,-204.72 -73.82,-244.09
  region: -44.29,-244.09 -44.29,-204.72 -54.13,-204.72 -54.13,-244.09
  region: -24.61,-244.09 -24.61,-204.72 -34.45,-204.72 -34.45,-244.09
  region: -4.84,-244.17 -4.84,-204.65 -14.69,-204.65 -14.69,-244.17
  region: 15,-244.33 15,-204.49 5.16,-204.49 5.16,-244.33
  region: 34.92,-244.41 34.92,-204.41 25.08,-204.41 25.08,-244.41
  region: 54.42,-243.91 54.42,-204.91 44.58,-204.91 44.58,-243.91
  region: 74.42,-243.91 74.42,-204.91 64.58,-204.91 64.58,-243.91
  region: 93.92,-244.41 93.92,-204.41 84.08,-204.41 84.08,-244.41
  region: 113.42,-243.91 113.42,-204.91 103.58,-204.91 103.58,-243.91
  region: 133.42,-243.91 133.42,-204.91 123.58,-204.91 123.58,-243.91
  region: 152.92,-244.41 152.92,-204.41 143.08,-204.41 143.08,-244.41
  region: 245,-142.72 205,-142.72 205,-152.56 245,-152.56
  region: 245,-123.03 205,-123.03 205,-132.87 245,-132.87
  region: 245,-103.35 205,-103.35 205,-113.19 245,-113.19
  region: 245,-83.66 205,-83.66 205,-93.5 245,-93.5
  region: 245,-63.98 205,-63.98 205,-73.82 245,-73.82
  region: 245,-44.29 205,-44.29 205,-54.13 245,-54.13
  region: 245,-24.61 205,-24.61 205,-34.45 245,-34.45
  region: 245,-4.92 205,-4.92 205,-14.76 245,-14.76
  region: 245,15 205,15 205,5 245,5
  region: 245,35 205,35 205,25 245,25
  region: 245,55 205,55 205,45 245,45
  region: 245,74 205,74 205,64 245,64
  region: 245,94 205,94 205,84 245,84
  region: 245,114 205,114 205,104 245,104
  region: 245,133 205,133 205,124 245,124
  region: 245,153 205,153 205,143 245,143
  region: 143,245 143,205 153,205 153,245
  region: 123.5,244.5 123.5,205.5 133.5,205.5 133.5,244.5
  region: 103.5,244.5 103.5,205.5 113.5,205.5 113.5,244.5
  region: 84,245 84,205 94,205 94,245
  region: 64.5,244.5 64.5,205.5 74.5,205.5 74.5,244.5
  region: 44.5,244.5 44.5,205.5 54.5,205.5 54.5,244.5
  region: 25,245 25,205 35,205 35,245
  region: 5.08,244.92 5.08,205.08 15.08,205.08 15.08,244.92
  region: -14.76,244.76 -14.76,205.24 -4.76,205.24 -4.76,244.76
  region: -34.53,244.69 -34.53,205.31 -24.53,205.31 -24.53,244.69
  region: -54.21,244.69 -54.21,205.31 -44.21,205.31 -44.21,244.69
  region: -73.9,244.69 -73.9,205.31 -63.9,205.31 -63.9,244.69
  region: -93.58,244.69 -93.58,205.31 -83.58,205.31 -83.58,244.69
  region: -113.27,244.69 -113.27,205.31 -103.27,205.31 -103.27,244.69
  region: -132.95,244.69 -132.95,205.31 -122.95,205.31 -122.95,244.69
  region: -152.64,244.69 -152.64,205.31 -142.64,205.31 -142.64,244.69
  rectangle: -157.48,-157.48 158,158
Mechanical 4:
  rectangle: -240.16,145 -200.59,151
  rectangle: -240.16,125 -200.59,132
  rectangle: -240.16,105 -200.59,112
  rectangle: -240.16,86 -200.59,92
  rectangle: -240.16,66 -200.59,73
  rectangle: -240.16,46 -200.59,53
  rectangle: -240.16,27 -200.59,33
  rectangle: -240.16,7 -200.59,14
  rectangle: -240.16,-13.19 -200.59,-6.5
  rectangle: -240.16,-32.87 -200.59,-26.18
  rectangle: -240.16,-52.56 -200.59,-45.87
  rectangle: -240.16,-72.24 -200.59,-65.55
  rectangle: -240.16,-91.93 -200.59,-85.24
  rectangle: -240.16,-111.61 -200.59,-104.92
  rectangle: -240.16,-131.3 -200.59,-124.61
  rectangle: -240.16,-150.98 -200.59,-144.29
  region: -144.29,-240.16 -144.29,-200.59 -150.98,-200.59 -150.98,-240.16
  region: -124.61,-240.16 -124.61,-200.59 -131.3,-200.59 -131.3,-240.16
  region: -104.92,-240.16 -104.92,-200.59 -111.61,-200.59 -111.61,-240.16
  region: -85.24,-240.16 -85.24,-200.59 -91.93,-200.59 -91.93,-240.16
  region: -65.55,-240.16 -65.55,-200.59 -72.24,-200.59 -72.24,-240.16
  region: -45.87,-240.16 -45.87,-200.59 -52.56,-200.59 -52.56,-240.16
  region: -26.18,-240.16 -26.18,-200.59 -32.87,-200.59 -32.87,-240.16
  region: -6.47,-240.19 -6.47,-200.56 -13.16,-200.56 -13.16,-240.19
  region: 13.38,-240.34 13.38,-200.4 6.68,-200.4 6.68,-240.34
  region: 33.35,-240.37 33.35,-200.37 26.65,-200.37 26.65,-240.37
  region: 52.85,-239.87 52.85,-200.87 46.15,-200.87 46.15,-239.87
  region: 72.85,-239.87 72.85,-200.87 66.15,-200.87 66.15,-239.87
  region: 92.35,-240.37 92.35,-200.37 85.65,-200.37 85.65,-240.37
  region: 112.35,-240.37 112.35,-200.37 105.65,-200.37 105.65,-240.37
  region: 131.85,-239.87 131.85,-200.87 125.15,-200.87 125.15,-239.87
  region: 151.35,-240.37 151.35,-200.37 144.65,-200.37 144.65,-240.37
  region: 241,-144.29 201,-144.29 201,-150.98 241,-150.98
  region: 241,-124.61 201,-124.61 201,-131.3 241,-131.3
  region: 241,-104.92 201,-104.92 201,-111.61 241,-111.61
  region: 241,-85.24 201,-85.24 201,-91.93 241,-91.93
  region: 241,-65.55 201,-65.55 201,-72.24 241,-72.24
  region: 241,-45.87 201,-45.87 201,-52.56 241,-52.56
  region: 241,-26.18 201,-26.18 201,-32.87 241,-32.87
  region: 241,-6.5 201,-6.5 201,-13.19 241,-13.19
  region: 241,14 201,14 201,7 241,7
  region: 241,33 201,33 201,27 241,27
  region: 241,53 201,53 201,46 241,46
  region: 241,73 201,73 201,66 241,66
  region: 241,92 201,92 201,86 241,86
  region: 241,112 201,112 201,105 241,105
  region: 241,132 201,132 201,125 241,125
  region: 241,151 201,151 201,145 241,145
  region: 145,241 145,201 151,201 151,241
  region: 125.5,240.5 125.5,201.5 131.5,201.5 131.5,240.5
  region: 106,241 106,201 112,201 112,241
  region: 86,241 86,201 92,201 92,241
  region: 66.5,240.5 66.5,201.5 72.5,201.5 72.5,240.5
  region: 46.5,240.5 46.5,201.5 52.5,201.5 52.5,240.5
  region: 27,241 27,201 33,201 33,241
  region: 7.03,240.97 7.03,201.03 13.03,201.03 13.03,240.97
  region: -12.81,240.81 -12.81,201.19 -6.81,201.19 -6.81,240.81
  region: -32.53,240.78 -32.53,201.22 -26.53,201.22 -26.53,240.78
  region: -52.21,240.78 -52.21,201.22 -46.21,201.22 -46.21,240.78
  region: -71.9,240.78 -71.9,201.22 -65.9,201.22 -65.9,240.78
  region: -91.58,240.78 -91.58,201.22 -85.58,201.22 -85.58,240.78
  region: -111.27,240.78 -111.27,201.22 -105.27,201.22 -105.27,240.78
  region: -130.95,240.78 -130.95,201.22 -124.95,201.22 -124.95,240.78
  region: -150.64,240.78 -150.64,201.22 -144.64,201.22 -144.64,240.78

## HTSSOP8DGN [mil]
pads (9):
  rect 16x40 smd: 1(-38.39,-84.65) 2(-12.8,-84.65) 3(13,-84.65) 4(39,-84.65) 5(39,85) 6(13,85) 7(-12.8,85) 8(-38.39,85)
  rect 119x79 smd: EXP(0,0)
Top Overlay:
  lines w4: -58.07,-58.07 59,-58.07 59,59 -58.07,59 -58.07,-58.07
Top Paste:
  rectangle: -45.87,-103.94 -30.91,-65.35
  rectangle: -20.28,-103.94 -5.32,-65.35
  rectangle: 6,-103.94 21,-65.35
  rectangle: 31,-103.94 46,-65.35
  region: 46,104 31,104 31,66 46,66
  region: 21,104 6,104 6,66 21,66
  region: -5.31,104 -20.28,104 -20.28,66 -5.32,66
  region: -30.91,104 -45.87,104 -45.87,66 -30.91,66
Top Solder:
  rectangle: -46.46,-104.53 -30.32,-64.76
  rectangle: -20.87,-104.53 -4.72,-64.76
  rectangle: 5,-104.53 21,-64.76
  rectangle: 31,-104.53 47,-64.76
  region: 47,105 31,105 31,65 47,65
  region: 21,105 5,105 5,65 21,65
  region: -4.72,105 -20.87,105 -20.87,65 -4.72,65
  region: -30.31,105 -46.46,105 -46.46,65 -30.32,65
  rectangle: -59.06,-39.37 60,40
Mechanical 4:
  rectangle: -46.26,-98.03 -30.51,-59.65
  rectangle: -20.67,-98.03 -4.92,-59.65
  rectangle: 5,-98.03 21,-59.65
  rectangle: 31,-98.03 47,-59.65
  region: 47,99 31,99 31,60 47,60
  region: 21,99 5,99 5,60 21,60
  region: -4.92,99 -20.67,99 -20.67,60 -4.92,60
  region: -30.51,99 -46.26,99 -46.26,60 -30.51,60

## HTSSOP14PWP [mil]
pads (15):
  rect 37x83 smd: 1(-89.84,-96.46) 7(90,-96.46) 8(90,97) 14(-89.84,97)
  rect 11x48 smd: 2(-51.18,-114.17) 3(-25.59,-114.17) 4(0,-114.17) 5(26,-114.17) 6(52,-114.17) 9(52,115) 10(26,115) 11(0,115) 12(-25.59,115) 13(-51.18,115)
  rect 217x119 smd: EXP(0,0)
Top Overlay:
  circle w8: c-76.77,-61.02 r12
  lines w8: -100.39,-84.65 101,-84.65 101,85 -100.39,85 -100.39,-84.65
Top Paste:
  rectangle: -66.93,-43.31 67,44
  rectangle: -81.89,93 -71.65,137
  rectangle: -56.3,93 -46.06,137
  rectangle: -30.71,93 -20.47,137
  rectangle: -5.12,93 6,137
  rectangle: 21,93 31,137
  rectangle: 47,93 57,137
  rectangle: 72,93 82,137
  region: 82,-92.13 72,-92.13 72,-136.22 82,-136.22
  region: 57,-92.13 47,-92.13 47,-136.22 57,-136.22
  region: 31,-92.13 21,-92.13 21,-136.22 31,-136.22
  region: 6,-92.13 -5.12,-92.13 -5.12,-136.22 6,-136.22
  region: -20.47,-92.13 -30.71,-92.13 -30.71,-136.22 -20.47,-136.22
  region: -46.06,-92.13 -56.3,-92.13 -56.3,-136.22 -46.06,-136.22
  region: -71.65,-92.13 -81.89,-92.13 -81.89,-136.22 -71.65,-136.22
Top Solder:
  rectangle: -82.09,-137.8 -71.46,-90.55
  rectangle: -56.5,-137.8 -45.87,-90.55
  rectangle: -30.91,-137.8 -20.28,-90.55
  rectangle: -5.32,-137.8 6,-90.55
  rectangle: 21,-137.8 31,-90.55
  rectangle: 46,-137.8 57,-90.55
  rectangle: 72,-137.8 83,-90.55
  region: 83,138 72,138 72,91 83,91
  region: 57,138 46,138 46,91 57,91
  region: 31,138 21,138 21,91 31,91
  region: 6,138 -5.31,138 -5.32,91 6,91
  region: -20.28,138 -30.91,138 -30.91,91 -20.28,91
  region: -45.87,138 -56.5,138 -56.5,91 -45.87,91
  region: -71.46,138 -82.09,138 -82.09,91 -71.46,91
  rectangle: -74.41,-51.18 75,52
Mechanical 4:
  rectangle: -82.68,-129.92 -70.87,-86.61
  rectangle: -57.09,-129.92 -45.28,-86.61
  rectangle: -31.5,-129.92 -19.68,-86.61
  rectangle: -5.91,-129.92 6,-86.61
  rectangle: 20,-129.92 32,-86.61
  rectangle: 46,-129.92 58,-86.61
  rectangle: 71,-129.92 83,-86.61
  region: 83,130 71,130 71,87 83,87
  region: 58,130 46,130 46,87 58,87
  region: 32,130 20,130 20,87 32,87
  region: 6,130 -5.91,130 -5.91,87 6,87
  region: -19.68,130 -31.5,130 -31.5,87 -19.69,87
  region: -45.28,130 -57.09,130 -57.09,87 -45.28,87
  region: -70.87,130 -82.68,130 -82.68,87 -70.87,87

## HTSSOP16PWP [mil]
pads (17):
  rect 25x83 smd: 1(-96.26,-96.46) 8(97,-96.46) 9(97,97) 16(-96.26,97)
  rect 11x48 smd: 2(-63.98,-114.17) 3(-38.39,-114.17) 4(-12.8,-114.17) 5(13,-114.17) 6(39,-114.17) 7(64,-114.17) 10(64,115) 11(39,115) 12(13,115) 13(-12.8,115) 14(-38.39,115) 15(-63.98,115)
  rect 217x119 smd: EXP(0,0)
Top Overlay:
  circle w8: c-76.77,-61.02 r12
  lines w8: -100.39,-84.65 -100.39,85 101,85 101,-84.65 -100.39,-84.65
Top Paste:
  region: -84.65,138 -94.49,138 -94.49,91 -84.65,91
  region: -59.06,138 -68.9,138 -68.9,91 -59.06,91
  region: -33.46,138 -43.31,138 -43.31,91 -33.46,91
  region: -7.87,138 -17.72,138 -17.72,91 -7.87,91
  region: 18,138 8,138 8,91 18,91
  region: 44,138 34,138 34,91 44,91
  region: 69,138 60,138 60,91 69,91
  region: 95,138 85,138 85,91 95,91
  rectangle: 85,-137.01 95,-90.94
  rectangle: 60,-137.01 69,-90.94
  rectangle: 34,-137.01 44,-90.94
  rectangle: 8,-137.01 18,-90.94
  rectangle: -17.72,-137.01 -7.87,-90.94
  rectangle: -43.31,-137.01 -33.46,-90.94
  rectangle: -68.9,-137.01 -59.06,-90.94
  rectangle: -94.49,-137.01 -84.65,-90.94
  rectangle: -70.87,-47.24 71,48
Top Solder:
  rectangle: -74.41,-51.18 75,52
  region: -84.25,138 -94.88,138 -94.88,91 -84.25,91
  region: -58.66,138 -69.29,138 -69.29,91 -58.66,91
  region: -33.07,138 -43.7,138 -43.7,91 -33.07,91
  region: -7.48,138 -18.11,138 -18.11,91 -7.48,91
  region: 19,138 8,138 8,91 19,91
  region: 44,138 34,138 34,91 44,91
  region: 70,138 59,138 59,91 70,91
  region: 95,138 85,138 85,91 95,91
  rectangle: 85,-137.8 95,-90.55
  rectangle: 59,-137.8 70,-90.55
  rectangle: 34,-137.8 44,-90.55
  rectangle: 8,-137.8 19,-90.55
  rectangle: -18.11,-137.8 -7.48,-90.55
  rectangle: -43.7,-137.8 -33.07,-90.55
  rectangle: -69.29,-137.8 -58.66,-90.55
  rectangle: -94.88,-137.8 -84.25,-90.55
Mechanical 4:
  region: -83.66,130 -95.47,130 -95.47,87 -83.66,87
  region: -58.07,130 -69.88,130 -69.88,87 -58.07,87
  region: -32.48,130 -44.29,130 -44.29,87 -32.48,87
  region: -6.89,130 -18.7,130 -18.7,87 -6.89,87
  region: 19,130 7,130 7,87 19,87
  region: 45,130 33,130 33,87 45,87
  region: 70,130 59,130 59,87 70,87
  region: 96,130 84,130 84,87 96,87
  rectangle: 84,-129.92 96,-86.61
  rectangle: 59,-129.92 70,-86.61
  rectangle: 33,-129.92 45,-86.61
  rectangle: 7,-129.92 19,-86.61
  rectangle: -18.7,-129.92 -6.89,-86.61
  rectangle: -44.29,-129.92 -32.48,-86.61
  rectangle: -69.88,-129.92 -58.07,-86.61
  rectangle: -95.47,-129.92 -83.66,-86.61

## HTSSOP20PWP [mil]
pads (21):
  rect 25x83 smd: 1(-121.85,-96.46) 10(122,-96.46) 11(122,97) 20(-121.85,97)
  rect 11x48 smd: 2(-89.57,-114.17) 3(-63.98,-114.17) 4(-38.39,-114.17) 5(-12.8,-114.17) 6(13,-114.17) 7(39,-114.17) 8(64,-114.17) 9(90,-114.17) 12(90,115) 13(64,115) 14(39,115) 15(13,115) 16(-12.8,115) 17(-38.39,115) 18(-63.98,115) 19(-89.57,115)
  rect 268x119 smd: EXP(0,0)
Top Overlay:
  circle w8: c-100.39,-59.06 r12
  lines w8: -125.98,-84.65 126,-84.65 126,85 -125.98,85 -125.98,-84.65
Top Paste:
  rectangle: -120.08,-137.01 -110.24,-90.94
  rectangle: -94.49,-137.01 -84.65,-90.94
  rectangle: -68.9,-137.01 -59.06,-90.94
  rectangle: -43.31,-137.01 -33.46,-90.94
  rectangle: -17.72,-137.01 -7.87,-90.94
  rectangle: 8,-137.01 18,-90.94
  rectangle: 34,-137.01 44,-90.94
  rectangle: 60,-137.01 69,-90.94
  rectangle: 85,-137.01 95,-90.94
  rectangle: 111,-137.01 121,-90.94
  region: 121,138 111,138 111,91 121,91
  region: 95,138 85,138 85,91 95,91
  region: 69,138 60,138 60,91 69,91
  region: 44,138 34,138 34,91 44,91
  region: 18,138 8,138 8,91 18,91
  region: -7.87,138 -17.72,138 -17.72,91 -7.87,91
  region: -33.46,138 -43.31,138 -43.31,91 -33.46,91
  region: -59.06,138 -68.9,138 -68.9,91 -59.06,91
  region: -84.65,138 -94.49,138 -94.49,91 -84.65,91
  region: -110.24,138 -120.08,138 -120.08,91 -110.24,91
  rectangle: -70.87,-47.24 71,48
Top Solder:
  rectangle: -120.47,-137.8 -109.84,-90.55
  rectangle: -94.88,-137.8 -84.25,-90.55
  rectangle: -69.29,-137.8 -58.66,-90.55
  rectangle: -43.7,-137.8 -33.07,-90.55
  rectangle: -18.11,-137.8 -7.48,-90.55
  rectangle: 8,-137.8 19,-90.55
  rectangle: 34,-137.8 44,-90.55
  rectangle: 59,-137.8 70,-90.55
  rectangle: 85,-137.8 95,-90.55
  rectangle: 110,-137.8 121,-90.55
  region: 121,138 110,138 110,91 121,91
  region: 95,138 85,138 85,91 95,91
  region: 70,138 59,138 59,91 70,91
  region: 44,138 34,138 34,91 44,91
  region: 19,138 8,138 8,91 19,91
  region: -7.48,138 -18.11,138 -18.11,91 -7.48,91
  region: -33.07,138 -43.7,138 -43.7,91 -33.07,91
  region: -58.66,138 -69.29,138 -69.29,91 -58.66,91
  region: -84.25,138 -94.88,138 -94.88,91 -84.25,91
  region: -109.84,138 -120.47,138 -120.47,91 -109.84,91
  rectangle: -74.41,-51.18 75,52
Mechanical 4:
  rectangle: -121.06,-129.92 -109.25,-86.61
  rectangle: -95.47,-129.92 -83.66,-86.61
  rectangle: -69.88,-129.92 -58.07,-86.61
  rectangle: -44.29,-129.92 -32.48,-86.61
  rectangle: -18.7,-129.92 -6.89,-86.61
  rectangle: 7,-129.92 19,-86.61
  rectangle: 33,-129.92 45,-86.61
  rectangle: 59,-129.92 70,-86.61
  rectangle: 84,-129.92 96,-86.61
  rectangle: 110,-129.92 122,-86.61
  region: 122,130 110,130 110,87 122,87
  region: 96,130 84,130 84,87 96,87
  region: 70,130 59,130 59,87 70,87
  region: 45,130 33,130 33,87 45,87
  region: 19,130 7,130 7,87 19,87
  region: -6.89,130 -18.7,130 -18.7,87 -6.89,87
  region: -32.48,130 -44.29,130 -44.29,87 -32.48,87
  region: -58.07,130 -69.88,130 -69.88,87 -58.07,87
  region: -83.66,130 -95.47,130 -95.47,87 -83.66,87
  region: -109.25,130 -121.06,130 -121.06,87 -109.25,87